# Altium footprint library Isengard.PcbLib: 150 footprints (part 7 of 10)
Each footprint in its own frame and in the unit in brackets; x right, y up, seen from the top. Pads: shape width x height; smd on the part's side, far side on the other; paste and mask are expansions set on the pad; w line width, h text height; cw(c..) or ccw(c..) is an arc to the next point about the centre after c.
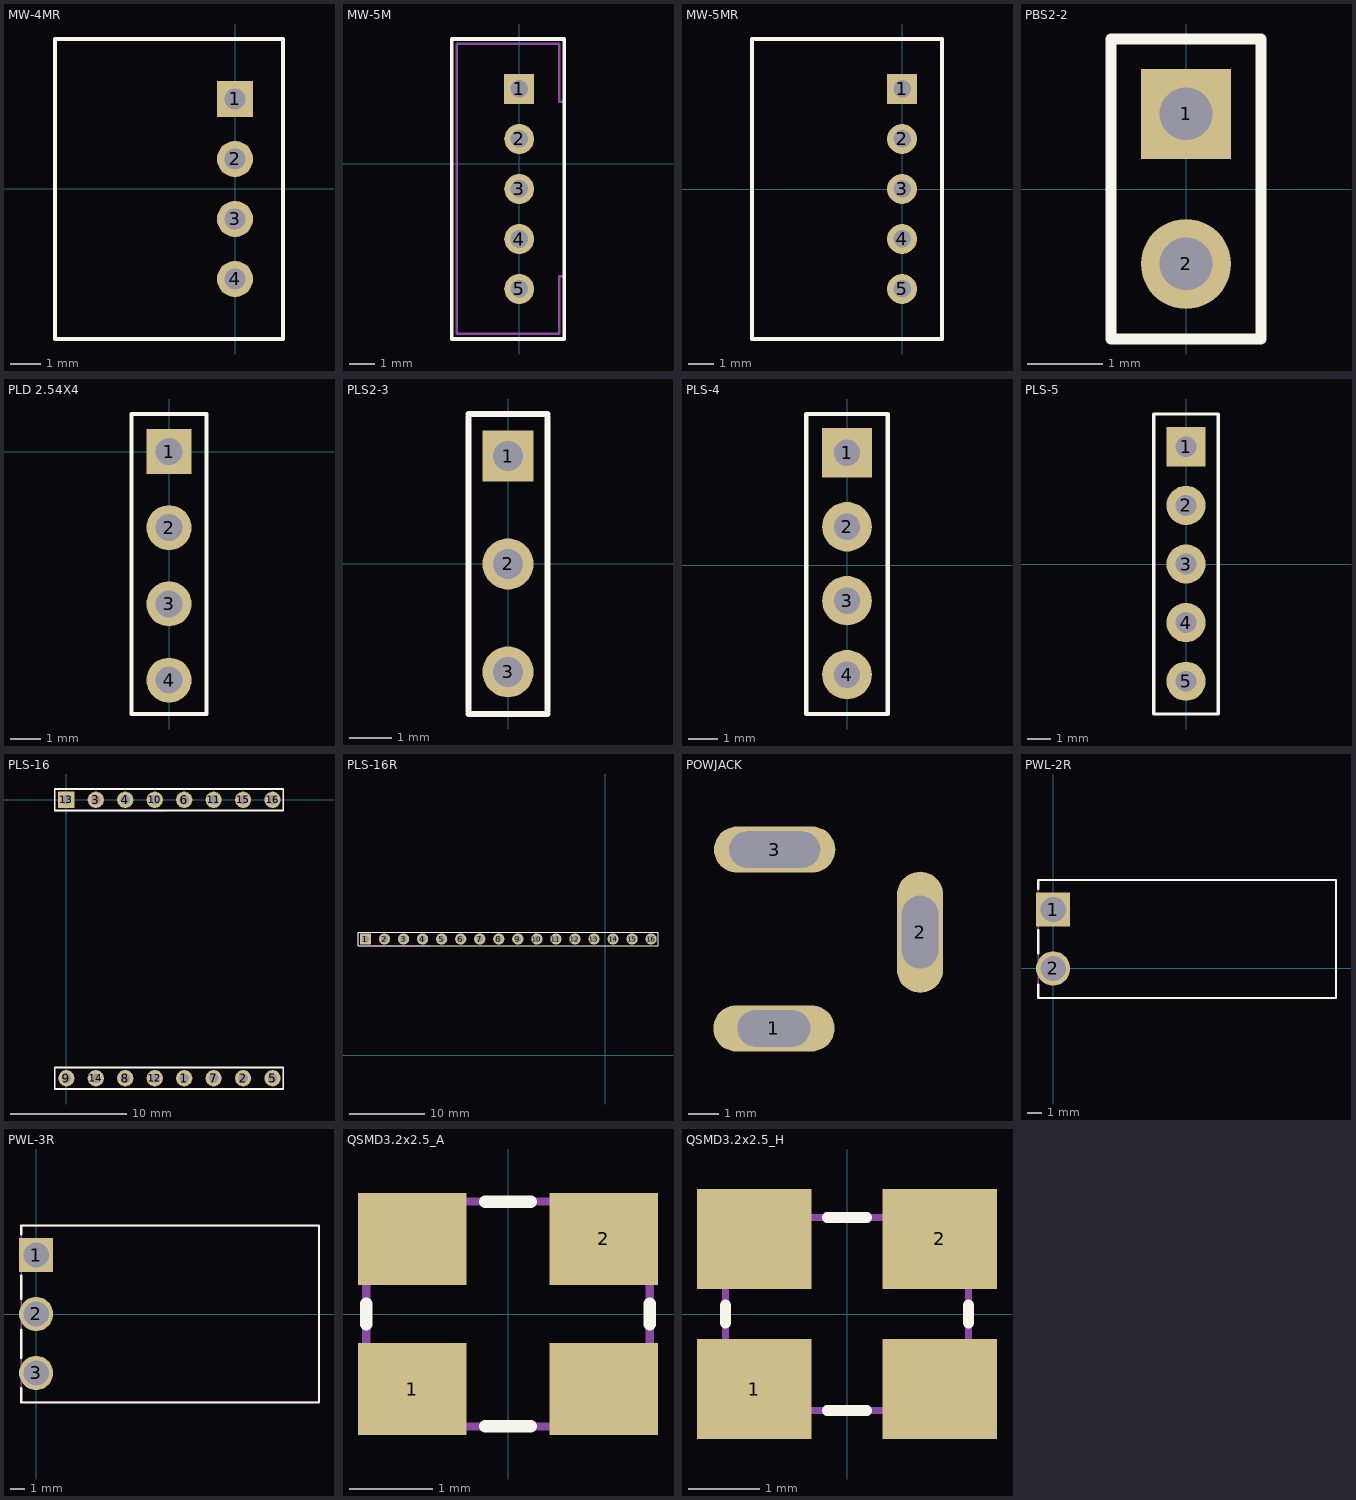
[diagram p6: the footprints below, top view; thin cyan lines are the x and y axes]

## MW-4MR [mm]
height 4.5
pads (4):
  rect 1.2x1.2 hole 0.7: 1(0,3)
  round 1.2 hole 0.7: 2(0,1) 3(0,-1) 4(0,-3)
Top Overlay:
  lines w0.15: -6,-5 -6,5 1.6,5 1.6,-5 -6,-5
Mechanical 7:
  lines w0.1: -6,-5 1.6,-5 1.6,5 -6,5 -6,-5
Mechanical 10:
  text ".Designator" at -3.43,6.03 h0.8
  text ".Comment" at -3.42,5.46 h0.6
3D body "S4B-PH-K-S.STEP": height 4.8, standoff -3.4, extent -6,-4.95 1.6,4.95

## MW-5M [mm]
pads (5):
  rect 1.2x1.2 hole 0.7: 1(0,3)
  round 1.2 hole 0.7: 2(0,1) 3(0,-1) 4(0,-3) 5(0,-5)
Top Overlay:
  lines w0.15: -2.7,-7 1.8,-7 1.8,5 -2.7,5 -2.7,-7
Mechanical 7:
  lines w0.1: 1.79,-4.5 1.6,-4.5 1.6,-6.8 -2.5,-6.8 -2.5,4.8 1.6,4.8 1.6,2.5 1.79,2.5 ; -2.7,-7 1.8,-7 1.8,5 -2.7,5 -2.7,-7
Mechanical 10:
  text ".Comment" at -1.27,5.41 h0.6
  text ".Designator" at -1.28,5.98 h0.8
3D body "B5B-PH-K-S.STEP": height 6, standoff -3.4, extent -2.7,-6.95 1.8,4.95

## MW-5MR [mm]
height 4.5
pads (5):
  rect 1.2x1.2 hole 0.7: 1(0,4)
  round 1.2 hole 0.7: 2(0,2) 3(0,0) 4(0,-2) 5(0,-4)
Top Overlay:
  lines w0.15: -6,-6 1.6,-6 1.6,6 -6,6 -6,-6
Mechanical 7:
  lines w0.1: -6,-6 1.6,-6 1.6,6 -6,6 -6,-6
Mechanical 10:
  text ".Designator" at -3.43,7.03 h0.8
  text ".Comment" at -3.42,6.46 h0.6
3D body "S5B-PH-K-S.STEP": height 4.8, standoff -3.4, extent -6,-5.95 1.6,5.95

## PBS2-2 [mm]
height 4.5
pads (2):
  rect 1.2x1.2 hole 0.7: 1(0,1)
  round 1.2 hole 0.7: 2(0,-1)
Top Overlay:
  lines w0.15: -1,-2 1,-2 1,2 -1,2 -1,-2
Mechanical 7:
  lines w0.1: -1,-2 1,-2 1,2 -1,2 -1,-2
Mechanical 10:
  text ".Designator" at -0.575,3.15 h0.8
  text ".Comment" at -0.575,2.475 h0.6
3D body: height 4.5, standoff 0, extent -1,-2 1,2

## PCBComponent_1 [mm]

## PLD 2.54X4 [mm]
pads (4):
  rect 1.5x1.5 hole 0.9: 1(0,0)
  round 1.5 hole 0.9: 2(0,-2.54) 3(0,-5.08) 4(0,-7.62)
Top Overlay:
  lines w0.15: -1.25,-8.75 1.25,-8.75 1.25,1.25 -1.25,1.25 -1.25,-8.75

## PLS2-3 [mm]
height 0.05
pads (3):
  rect 1.2x1.2 hole 0.7: 1(0,2.54)
  round 1.2 hole 0.7: 2(0,0) 3(0,-2.54)
Top Overlay:
  lines w0.15: -0.93,-3.53 0.93,-3.53 ; -0.93,-3.47 -0.93,3.47 ; -0.93,3.53 0.93,3.53 ; 0.93,-3.47 0.93,3.47
Mechanical 7:
  lines w0.1: -0.93,-3.53 0.93,-3.53 ; -0.93,-3.47 -0.93,3.47 ; -0.93,3.53 0.93,3.53 ; 0.93,-3.47 0.93,3.47
Mechanical 10:
  text ".Designator" at -0.3,3.7 h0.8
  text ".Comment" at -0.7,-4.1 h0.6
3D body "User Library-PLS-3.step": height 8.54, standoff -3, extent -1.24,-3.81 1.3,3.81

## PLS-4 [mm]
height 0.05
pads (4):
  rect 1.7x1.7 hole 0.9: 1(0,3.87)
  round 1.7 hole 0.9: 2(0,1.33) 3(0,-1.21)
  round 1.7 hole 0.9 mask+0.102: 4(0,-3.75)
Top Overlay:
  lines w0.15: -1.4,-5.1 1.4,-5.1 1.4,5.2 -1.4,5.2 -1.4,-5.1
Mechanical 7:
  lines w0.1: -1.4,-5.1 1.4,-5.1 1.4,5.2 -1.4,5.2 -1.4,-5.1
Mechanical 10:
  text ".Designator" at 1.2,4.65 h0.8
  text ".Comment" at 1.1,-4.05 h0.6
3D body "Pin Header 1x4 TH Pitch 2.54mm.stp": height 9.5, standoff -3.2, extent -1.27,-5.02 1.27,5.14

## PLS-5 [mm]
height 0.05
pads (5):
  rect 1.7x1.7 hole 0.9: 1(0,5.08)
  round 1.7 hole 0.9: 2(0,2.54) 3(0,0)
  round 1.7 hole 0.9 mask+0.102: 4(0,-2.54) 5(0,-5.08)
Top Overlay:
  lines w0.15: -1.4,-6.5 1.4,-6.5 1.4,6.5 -1.4,6.5 -1.4,-6.5
Mechanical 7:
  lines w0.1: -1.4,-6.5 -1.4,6.5 1.4,6.5 1.4,-6.5 -1.4,-6.5
Mechanical 10:
  text ".Comment" at 1.1,-2.84 h0.6
  text ".Designator" at 1.2,4.65 h0.8
3D body "User Library-PLS-5.step": height 8.54, standoff -3, extent -1.25,-6.35 1.29,6.35

## PLS-16 [mm] "LED Matrix BL-M12"
height 0.05
pads (16):
  round 1.4 hole 0.8: 1(10.16,-24) 3(2.54,0) 4(5.08,0) 6(10.16,0) 7(12.7,-24) 8(5.08,-24) 9(0,-24) 11(12.7,0) 14(2.54,-24)
  round 1.4 hole 0.8 mask+0.102: 2(15.24,-24) 5(17.78,-24) 10(7.62,0) 12(7.62,-24) 15(15.24,0) 16(17.78,0)
  rect 1.4x1.4 hole 0.8: 13(0,0)
Top Overlay:
  lines w0.15: -1,-24.93 18.7,-24.93 18.7,-23.07 -1,-23.07 -1,-24.93 ; -1,-0.93 -1,0.93 18.7,0.93 18.7,-0.93 -1,-0.93
Mechanical 7:
  lines w0.1: 8.54,-24.93 -1,-24.93 -1,-23.07 18.695,-23.07 ; 8.54,-0.93 -1,-0.93 -1,0.93 18.695,0.93
Mechanical 10:
  text ".Designator" at -0.425,9.7 h0.8
  text ".Comment" at 0.05,9.1 h0.6
3D body "LED Matrix.STEP": height 8.2, standoff -4.3, extent -7.16,-28 24.84,4

## PLS-16R [mm] "LED Matrix BL-M12"
height 0.05
pads (16):
  rect 1.5x1.5 hole 0.9: 1(-32,15.5)
  round 1.5 hole 0.9: 2(-29.46,15.5) 3(-26.92,15.5) 5(-21.84,15.5) 6(-19.3,15.5) 9(-11.68,15.5) 10(-9.14,15.5) 12(-4.06,15.5) 13(-1.52,15.5)
  round 1.5 hole 0.9 mask+0.102: 4(-24.38,15.5) 7(-16.76,15.5) 8(-14.22,15.5) 11(-6.6,15.5) 14(1.02,15.5) 15(3.56,15.5) 16(6.1,15.5)
Top Overlay:
  lines w0.15: -33,14.57 7.02,14.57 7.02,16.43 -33,16.43 -33,14.57
Mechanical 7:
  lines w0.1: -23.46,14.57 -33,14.57 -33,16.43 7.02,16.43
Mechanical 10:
  text ".Comment" at 0.05,9.1 h0.6
  text ".Designator" at -0.425,9.7 h0.8
3D body "lcd_siplay.STEP": height 2.65, standoff -10.31, extent -40,-18 40,18

## POWJACK [mm]
pads (3):
  oval 4x1.524 hole 1.2 slot 2.4 at 0 deg: 1(-14.825,24.775)
  oval 1.524x4 hole 1.2 slot 2.4 at 90 deg: 2(-10,27.95)
  oval 4x1.524 hole 1.2 slot 3 at 0 deg: 3(-14.8,30.675)
3D body "User_Library-ds-210.step": height 11.3, standoff -4.1, extent -19.3,16.9 -9.75,31.4

## PWL-2R [mm]
height 10.2
pads (2):
  rect 2.3x2.3 hole 1.7: 1(0,3.96)
  round 2.3 hole 1.7: 2(0,0)
Top Overlay:
  lines w0.15: -1,-1.98 19,-1.98 19,5.94 -1,5.94 -1,5.35 ; -1,-1.975 -1,-1.1 ; -1,1 -1,2.575
Mechanical 7:
  lines w0.1: -1,-1.98 19,-1.98 19,5.94 -1,5.94 -1,-1.98
Mechanical 10:
  text ".Comment" at 7.955,6.66 h0.6
  text ".Designator" at 7.945,7.23 h0.8
3D body: height 10.2, standoff 0, extent -1,-1.98 19,5.94

## PWL-3R [mm]
height 10.2
pads (3):
  rect 2.3x2.3 hole 1.7: 1(0,3.96)
  round 2.3 hole 1.7: 2(0,0) 3(0,-3.96)
Top Overlay:
  lines w0.15: -1,-4.975 -1,-5.94 19,-5.94 19,5.94 -1,5.94 -1,5.35 ; -1,-2.95 -1,-1.05 ; -1,1.025 -1,2.575
Mechanical 7:
  lines w0.1: -1,-5.94 19,-5.94 19,5.94 -1,5.94 -1,-5.94
Mechanical 10:
  text ".Designator" at 7.945,7.23 h0.8
  text ".Comment" at 7.955,6.66 h0.6
3D body: height 10.2, standoff 0, extent -1,-5.94 19,5.94

## QSMD3.2x2.5_A [mm]
height 1.2
pads (4):
  rect 1.3x1.1 smd: 1(-1.15,-0.9) 2(1.15,0.9) ""(-1.15,0.9) ""(1.15,-0.9)
Top Overlay:
  lines w0.15: -1.7,-0.125 -1.7,0.125 ; -0.275,-1.35 0.275,-1.35 ; -0.275,1.35 0.275,1.35 ; 1.7,-0.125 1.7,0.125
Mechanical 7:
  lines w0.1: -1.7,-1.35 1.7,-1.35 1.7,1.35 -1.7,1.35 -1.7,-1.35
Mechanical 10:
  text ".Comment" at -0.825,1.85 h0.6
  text ".Designator" at -0.85,2.425 h0.8
3D body: height 1.2, standoff 0, extent -1.7,-1.35 1.7,1.35

## QSMD3.2x2.5_H [mm]
height 1.2
pads (4):
  rect 1.6x1.4 smd: 1(-1.3,-1.05) 2(1.3,1.05) ""(-1.3,1.05) ""(1.3,-1.05)
Top Overlay:
  lines w0.15: -1.7,-0.125 -1.7,0.125 ; -0.275,-1.35 0.275,-1.35 ; -0.275,1.35 0.275,1.35 ; 1.7,-0.125 1.7,0.125
Mechanical 7:
  lines w0.1: -1.7,-1.35 1.7,-1.35 1.7,1.35 -1.7,1.35 -1.7,-1.35
Mechanical 10:
  text ".Comment" at -0.8,2.175 h0.6
  text ".Designator" at -0.825,2.75 h0.8
3D body: height 1.2, standoff 0, extent -1.7,-1.35 1.7,1.35